# Altium footprint library Phoenix.PcbLib: 54 footprints (part 3 of 4)
Each footprint in its own frame and in the unit in brackets; x right, y up, seen from the top. Pads: shape width x height; smd on the part's side, far side on the other; paste and mask are expansions set on the pad; w line width, h text height; cw(c..) or ccw(c..) is an arc to the next point about the centre after c.
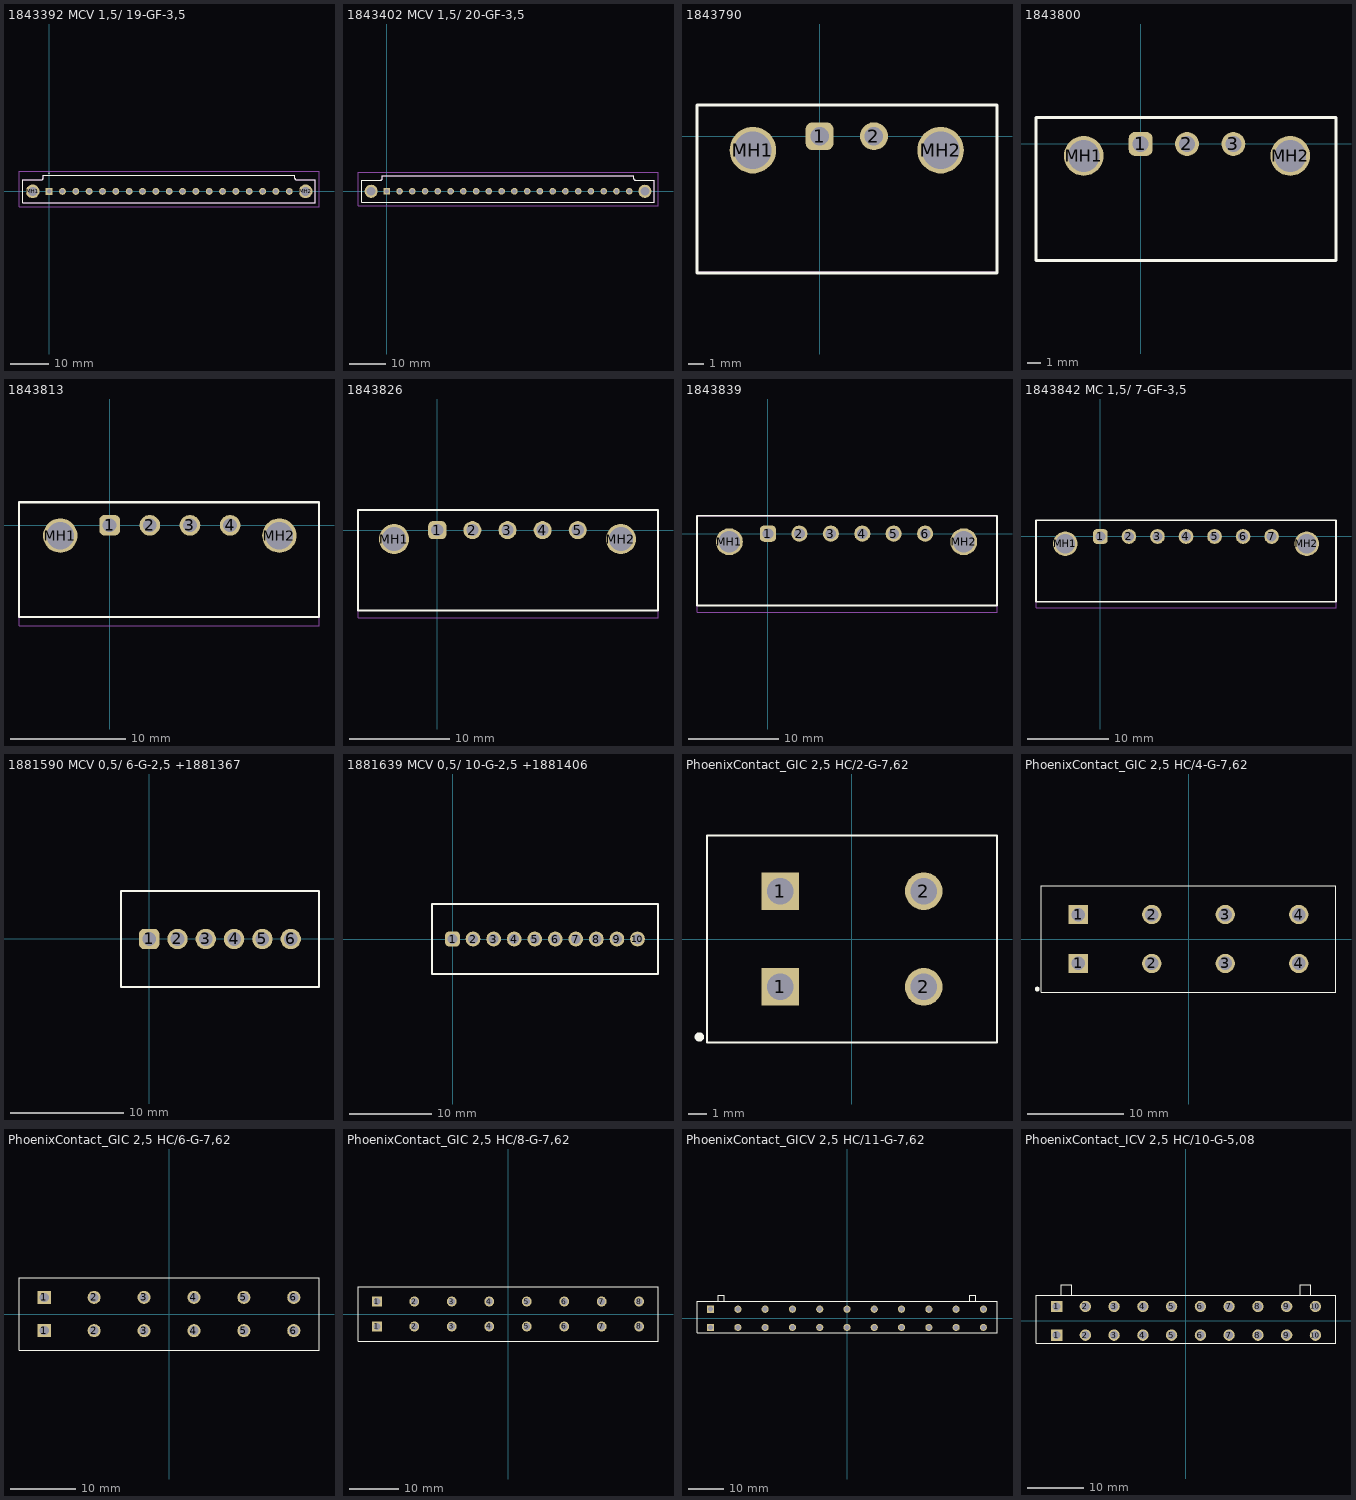
[diagram p2: the footprints below, top view; thin cyan lines are the x and y axes]

## 1843392 MCV 1,5/ 19-GF-3,5 [mm]
pads (21):
  rect 1.8x1.8 hole 1.2: 1(0,0)
  round 1.8 hole 1.2: 2(3.5,0) 3(7,0) 4(10.5,0) 5(14,0) 6(17.5,0) 7(21,0) 8(24.5,0) 9(28,0) 10(31.5,0) 11(35,0) 12(38.5,0) 13(42,0) 14(45.5,0) 15(49,0) 16(52.5,0) 17(56,0) 18(59.5,0) 19(63,0)
  round 3.6 hole 2.4: MH1(-4.3,0) MH2(67.3,0)
Top Overlay:
  lines w0.1: 0,4.7 ccw(c0,4.75) 0,4.8 ccw(c0,4.75) 0,4.7
  lines w0.2: -6.9,-3 69.8,-3 69.8,3 64.95,3 cw(c64.95,3.5) 64.45,3.5 64.45,4.25 -1.55,4.25 -1.55,3.5 cw(c-2.05,3.5) -2.05,3 -6.9,3 -6.9,-3
Mechanical 13:
  lines w0.1: -6.9,-3 69.8,-3 69.8,3 64.95,3 cw(c64.95,3.5) 64.45,3.5 64.45,4.25 -1.55,4.25 -1.55,3.5 cw(c-2.05,3.5) -2.05,3 -6.9,3 -6.9,-3
Mechanical 15:
  lines w0.1: -7.9,-4 -7.9,5.25 70.8,5.25 70.8,-4 -7.9,-4
3D body "1843392.stp": height 9.72, standoff -2.88, extent -6.95,-4.25 69.85,3

## 1843402 MCV 1,5/ 20-GF-3,5 [mm]
pads (22):
  rect 1.8x1.8 hole 1.2: 1(0,0)
  round 1.8 hole 1.2: 2(3.5,0) 3(7,0) 4(10.5,0) 5(14,0) 6(17.5,0) 7(21,0) 8(24.5,0) 9(28,0) 10(31.5,0) 11(35,0) 12(38.5,0) 13(42,0) 14(45.5,0) 15(49,0) 16(52.5,0) 17(56,0) 18(59.5,0) 19(63,0) 20(66.5,0)
  round 3.6 hole 2.4: MH1(-4.3,0) MH2(70.8,0)
Top Overlay:
  lines w0.1: 0,-3.6 ccw(c0,-3.55) 0,-3.5 ccw(c0,-3.55) 0,-3.6
  lines w0.2: -6.9,-3 -6.9,3 -1.75,3 ccw(c-1.75,3.5) -1.25,3.5 -1.25,4.25 67.75,4.25 67.75,3.5 ccw(c68.25,3.5) 68.25,3 73.4,3 73.4,-3 -6.9,-3
Mechanical 13:
  lines w0.1: -6.9,-3 -6.9,3 -1.75,3 ccw(c-1.75,3.5) -1.25,3.5 -1.25,4.25 67.75,4.25 67.75,3.5 ccw(c68.25,3.5) 68.25,3 73.4,3 73.4,-3 -6.9,-3
Mechanical 15:
  lines w0.1: -7.9,-4 74.4,-4 74.4,5.25 -7.9,5.25 -7.9,-4
3D body "1843402.stp": height 9.7, standoff -2.9, extent -6.9,-3 73.4,4.25

## 1843790 [mm]
pads (4):
  rrect50% 1.8x1.8 hole 1.2: 1(0,0)
  round 1.8 hole 1.2: 2(3.5,0)
  round 3 / inner round 3.6 / far side round 5 hole 2.4: MH1(-4.3,-0.9) MH2(7.8,-0.9)
Top Overlay:
  lines w0.2: -7.9,-8.8 -7.9,2 11.43,2 11.43,-8.8 -7.9,-8.8
Mechanical 15:
  lines w0.1: -7.9,-8.75 11.43,-8.75 11.43,2 -7.9,2 -7.9,-8.75
3D body "1940091.stp": height 8.4, standoff -4, extent -6.925,-30.325 10.375,-9.525
3D body "Wuerth_5051022045_ISO_7049_Stahl_verzinkt_Linsenkopf_Z_Form_C.stp": height 2.9, standoff -3.2, extent -6.3,-2.9 -2.3,1.1
3D body "Wuerth_5051022045_ISO_7049_Stahl_verzinkt_Linsenkopf_Z_Form_C.stp": height 2.9, standoff -3.2, extent 5.8,-2.889 9.8,1.089
3D body "1843790.stp": height 7.25, standoff -3.4, extent -6.9,-8 10.4,1.2

## 1843800 [mm]
pads (5):
  rrect50% 1.8x1.8 hole 1.2: 1(0,0)
  round 1.8 hole 1.2: 2(3.5,0) 3(7,0)
  round 3 / inner round 3.6 / far side round 5 hole 2.4: MH1(-4.3,-0.9) MH2(11.3,-0.9)
Top Overlay:
  lines w0.2: -7.9,-8.8 -7.9,2 14.75,2 14.75,-8.8 -7.9,-8.8
Mechanical 15:
  lines w0.1: -7.9,-8.75 14.75,-8.75 14.75,2 -7.9,2 -7.9,-8.75
3D body "Wuerth_5051022045_ISO_7049_Stahl_verzinkt_Linsenkopf_Z_Form_C.stp": height 2.9, standoff -3.2, extent -6.3,-2.9 -2.3,1.1
3D body "Wuerth_5051022045_ISO_7049_Stahl_verzinkt_Linsenkopf_Z_Form_C.stp": height 2.9, standoff -3.2, extent 9.3,-2.889 13.3,1.089
3D body "1940101.stp": height 8.4, standoff -4, extent -6.925,-30.325 13.875,-9.525
3D body "1843800.stp": height 7.25, standoff -3.4, extent -6.9,-8 13.9,1.2

## 1843813 [mm]
pads (6):
  rrect50% 1.8x1.8 hole 1.2: 1(0,0)
  round 1.8 hole 1.2: 2(3.5,0) 3(7,0) 4(10.5,0)
  round 3 / inner round 3.6 / far side round 5 hole 2.4: MH1(-4.3,-0.9) MH2(14.8,-0.9)
Top Overlay:
  lines w0.2: -7.9,-8 -7.9,2 18.25,2 18.25,-8 -7.9,-8
Mechanical 15:
  lines w0.1: -7.9,-8.75 18.25,-8.75 18.25,2 -7.9,2 -7.9,-8.75
3D body "1843813.stp": height 7.25, standoff -3.4, extent -6.9,-8 17.4,1.2
3D body "1940114.stp": height 8.4, standoff -4, extent -6.925,-30.325 17.375,-9.525
3D body "Wuerth_5051022045_ISO_7049_Stahl_verzinkt_Linsenkopf_Z_Form_C.stp": height 2.9, standoff -3.2, extent -6.3,-2.9 -2.3,1.1
3D body "Wuerth_5051022045_ISO_7049_Stahl_verzinkt_Linsenkopf_Z_Form_C.stp": height 2.9, standoff -3.2, extent 12.8,-2.889 16.8,1.089

## 1843826 [mm]
pads (7):
  rrect50% 1.8x1.8 hole 1.2: 1(0,0)
  round 1.8 hole 1.2: 2(3.5,0) 3(7,0) 4(10.5,0) 5(14,0)
  round 3 / inner round 3.6 / far side round 5 hole 2.4: MH1(-4.3,-0.9) MH2(18.3,-0.9)
Top Overlay:
  lines w0.2: -7.9,-8 -7.9,2 22,2 22,-8 -7.9,-8
Mechanical 15:
  lines w0.1: -7.9,-8.75 22,-8.75 22,2 -7.9,2 -7.9,-8.75
3D body "1940127.stp": height 8.4, standoff -4, extent -6.925,-30.325 20.875,-9.525
3D body "Wuerth_5051022045_ISO_7049_Stahl_verzinkt_Linsenkopf_Z_Form_C.stp": height 2.9, standoff -3.2, extent 16.3,-2.889 20.3,1.089
3D body "Wuerth_5051022045_ISO_7049_Stahl_verzinkt_Linsenkopf_Z_Form_C.stp": height 2.9, standoff -3.2, extent -6.3,-2.9 -2.3,1.1
3D body "1843826.stp": height 7.25, standoff -3.4, extent -6.9,-8 20.9,1.2

## 1843839 [mm]
pads (8):
  rrect50% 1.8x1.8 hole 1.2: 1(0,0)
  round 1.8 hole 1.2: 2(3.5,0) 3(7,0) 4(10.5,0) 5(14,0) 6(17.5,0)
  round 3 / inner round 3.6 / far side round 5 hole 2.4: MH1(-4.3,-0.9) MH2(21.8,-0.9)
Top Overlay:
  lines w0.2: -7.9,-8 25.5,-8 25.5,2 -7.9,2 -7.9,-8
Mechanical 15:
  lines w0.1: -7.9,-8.75 -7.9,2 25.5,2 25.5,-8.75 -7.9,-8.75
3D body "1843839.stp": height 7.25, standoff -3.4, extent -6.9,-8 24.4,1.2
3D body "1940130.stp": height 8.4, standoff -4, extent -6.925,-30.325 24.375,-9.525
3D body "Wuerth_5051022045_ISO_7049_Stahl_verzinkt_Linsenkopf_Z_Form_C.stp": height 2.9, standoff -3.2, extent 19.8,-2.889 23.8,1.089
3D body "Wuerth_5051022045_ISO_7049_Stahl_verzinkt_Linsenkopf_Z_Form_C.stp": height 2.9, standoff -3.2, extent -6.3,-2.9 -2.3,1.1

## 1843842 MC 1,5/ 7-GF-3,5 [mm]
pads (9):
  rrect50% 1.8x1.8 hole 1.2: 1(0,0)
  round 1.8 hole 1.2: 2(3.5,0) 3(7,0) 4(10.5,0) 5(14,0) 6(17.5,0) 7(21,0)
  round 3 / inner round 3.6 / far side round 5 hole 2.4: MH1(-4.3,-0.9) MH2(25.3,-0.9)
Top Overlay:
  lines w0.2: -7.9,-8 28.9,-8 28.9,2 -7.9,2 -7.9,-8
Mechanical 15:
  lines w0.1: -7.9,-8.75 -7.9,2 28.9,2 28.9,-8.75 -7.9,-8.75
3D body "1843842.stp": height 7.25, standoff -3.4, extent -6.9,-8 27.9,1.2
3D body "Wuerth_5051022045_ISO_7049_Stahl_verzinkt_Linsenkopf_Z_Form_C.stp": height 2.9, standoff -3.2, extent 23.3,-2.9 27.3,1.1
3D body "Wuerth_5051022045_ISO_7049_Stahl_verzinkt_Linsenkopf_Z_Form_C.stp": height 2.9, standoff -3.2, extent -6.3,-2.9 -2.3,1.1
3D body "1940143.stp": height 8.4, standoff -4, extent -6.9,-30.2 27.9,-9.4

## 1881590 MCV 0,5/ 6-G-2,5 +1881367 [mm]
pads (6):
  rrect50% 1.8x1.8 hole 1.2 unplated: 1(0,0)
  round 1.8 hole 1.2 unplated: 2(2.5,0) 3(5,0) 4(7.5,0) 5(10,0) 6(12.5,0)
Top Overlay:
  lines w0.2: -2.5,-4.25 15,-4.25 15,4.25 -2.5,4.25 -2.5,-4.25
3D body "1881590.stp": height 10.1, standoff -3.5, extent -2.2,-4 14.7,4.1
3D body "1881367.stp": height 26.7, standoff 7.65, extent -1.52,-4.07 14.1,7.7

## 1881639 MCV 0,5/ 10-G-2,5 +1881406 [mm]
pads (10):
  rrect50% 1.8x1.8 hole 1.2 unplated: 1(0,0)
  round 1.8 hole 1.2 unplated: 2(2.5,0) 3(5,0) 4(7.5,0) 5(10,0) 6(12.5,0) 7(15,0) 8(17.5,0) 9(20,0) 10(22.5,0)
Top Overlay:
  lines w0.2: -2.5,-4.25 25,-4.25 25,4.25 -2.5,4.25 -2.5,-4.25
3D body "1881639.stp": height 10.1, standoff -3.5, extent -2.15,-3.9 24.75,4.2
3D body "1881406.stp": height 31.7, standoff 12.65, extent -1.52,-3.92 24.1,7.85

## PhoenixContact_GIC 2,5 HC/2-G-7,62 [mm] "Base strip - GIC 2,5 HC/ 2-G-7,62 - 1745784"
pads (4):
  rect 2x2 hole 1.4: 1(-3.81,-2.54) 1(-3.81,2.54)
  round 2 hole 1.4: 2(3.81,-2.54) 2(3.81,2.54)
Top Overlay:
  circle w0.25: c-8.1,-5.2 r0.125
  lines w0.1: -7.7,-5.5 7.7,-5.5 7.7,5.5 -7.7,5.5 -7.7,-5.5
3D body "1745784_01.stp": height 10.21, standoff -3.49, extent -7.57,-13.65 7.57,5.35

## PhoenixContact_GIC 2,5 HC/4-G-7,62 [mm] "Base strip - GIC 2,5 HC/ 4-G-7,62 - 1745807"
pads (8):
  rect 2x2 hole 1.4: 1(-11.43,-2.54) 1(-11.43,2.54)
  round 2 hole 1.4: 2(-3.81,-2.54) 2(-3.81,2.54) 3(3.81,-2.54) 3(3.81,2.54) 4(11.43,-2.54) 4(11.43,2.54)
Top Overlay:
  circle w0.25: c-15.7,-5.2 r0.125
  lines w0.1: -15.3,-5.5 15.3,-5.5 15.3,5.5 -15.3,5.5 -15.3,-5.5
3D body "1745807_01.stp": height 10.21, standoff -3.49, extent -15.19,-13.65 15.19,5.35

## PhoenixContact_GIC 2,5 HC/6-G-7,62 [mm] "Base strip - GIC 2,5 HC/ 6-G-7,62 - 1745823"
pads (12):
  rect 2x2 hole 1.4: 1(-19.05,-2.54) 1(-19.05,2.54)
  round 2 hole 1.4: 2(-11.43,-2.54) 2(-11.43,2.54) 3(-3.81,-2.54) 3(-3.81,2.54) 4(3.81,-2.54) 4(3.81,2.54) 5(11.43,-2.54) 5(11.43,2.54) 6(19.05,-2.54) 6(19.05,2.54)
Top Overlay:
  lines w0.1: -22.9,-5.5 -22.9,5.5 22.9,5.5 22.9,-5.5 -22.9,-5.5
3D body "1745823_01.stp": height 10.21, standoff -3.49, extent -22.81,-13.65 22.81,5.35

## PhoenixContact_GIC 2,5 HC/8-G-7,62 [mm] "Base strip"
pads (16):
  rect 2x2 hole 1.4: 1(-26.67,-2.54) 1(-26.67,2.54)
  round 2 hole 1.4: 2(-19.05,-2.54) 2(-19.05,2.54) 3(-11.43,-2.54) 3(-11.43,2.54) 4(-3.81,-2.54) 4(-3.81,2.54) 5(3.81,-2.54) 5(3.81,2.54) 6(11.43,-2.54) 6(11.43,2.54) 7(19.05,-2.54) 7(19.05,2.54) 8(26.67,-2.54) 8(26.67,2.54)
Top Overlay:
  lines w0.1: -30.5,-5.5 30.5,-5.5 30.5,5.5 -30.5,5.5 -30.5,-5.5
3D body "1745849_01.stp": height 10.21, standoff -3.49, extent -30.43,-13.65 30.43,5.35

## PhoenixContact_GICV 2,5 HC/11-G-7,62 [mm] "Printed-circuit board connector"
pads (22):
  rect 2x2 hole 1.4: 1(-38.1,-2.54) 1(-38.1,2.54)
  round 2 hole 1.4: 2(-30.48,-2.54) 2(-30.48,2.54) 3(-22.86,-2.54) 3(-22.86,2.54) 4(-15.24,-2.54) 4(-15.24,2.54) 5(-7.62,-2.54) 5(-7.62,2.54) 6(0,-2.54) 6(0,2.54) 7(7.62,-2.54) 7(7.62,2.54) 8(15.24,-2.54) 8(15.24,2.54) 9(22.86,-2.54) 9(22.86,2.54) 10(30.48,-2.54) 10(30.48,2.54) 11(38.1,-2.54) 11(38.1,2.54)
Top Overlay:
  lines w0.1: -35.9,4.7 -35.9,6.4 -34.3,6.4 -34.3,4.7 ; 34.3,4.7 34.3,6.4 35.9,6.4 35.9,4.7 ; -41.9,-4 -41.9,4.7 41.9,4.7 41.9,-4 -41.9,-4
3D body "1756579_01.stp": height 19.04, standoff -3.37, extent -41.868,-3.905 41.86,6.295

## PhoenixContact_ICV 2,5 HC/10-G-5,08 [mm] "Base strip"
pads (20):
  rect 2x2 hole 1.4: 1(-22.86,-2.54) 1(-22.86,2.54)
  round 2 hole 1.4: 2(-17.78,-2.54) 2(-17.78,2.54) 3(-12.7,-2.54) 3(-12.7,2.54) 4(-7.62,-2.54) 4(-7.62,2.54) 5(-2.54,-2.54) 5(-2.54,2.54) 6(2.54,-2.54) 6(2.54,2.54) 7(7.62,-2.54) 7(7.62,2.54) 8(12.7,-2.54) 8(12.7,2.54) 9(17.78,-2.54) 9(17.78,2.54) 10(22.86,-2.54) 10(22.86,2.54)
Top Overlay:
  lines w0.1: -22,4.5 -22,6.4 -20.2,6.4 -20.2,4.5 ; 20.2,4.5 20.2,6.4 22,6.4 22,4.5 ; -26.5,-4 26.5,-4 26.5,4.5 -26.5,4.5 -26.5,-4
3D body "1943616_02.stp": height 19.03, standoff -3.59, extent -26.408,-3.9 26.4,6.3